# Altium footprint library RDM_ALT_PCB.PcbLib: 127 footprints (part 7 of 8)
Each footprint in its own frame and in the unit in brackets; x right, y up, seen from the top. Pads: shape width x height; smd on the part's side, far side on the other; paste and mask are expansions set on the pad; w line width, h text height; cw(c..) or ccw(c..) is an arc to the next point about the centre after c.
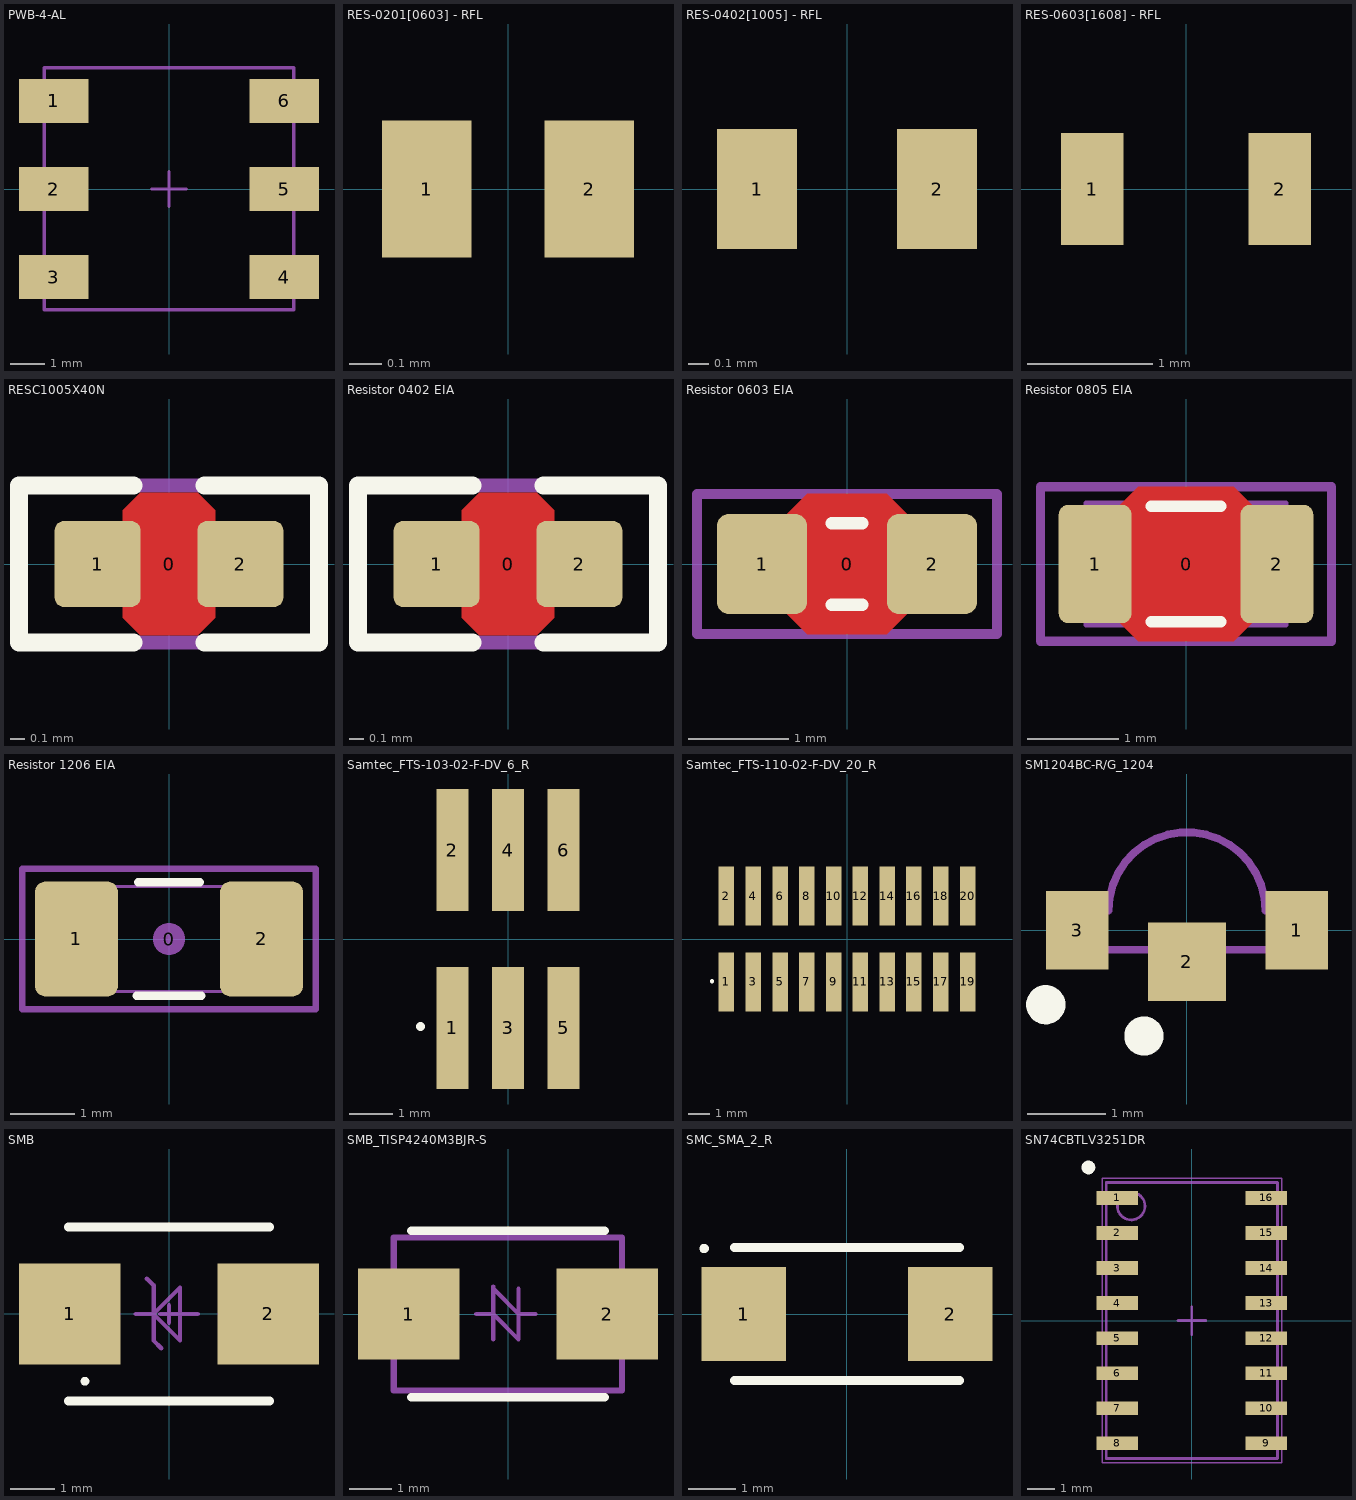
[diagram p6: the footprints below, top view; thin cyan lines are the x and y axes]

## PWB-4-AL [mm] "Surface Mount Wideband RF Transformer"
height 3.7
pads (6):
  rect 2x1.27 smd: 1(-3.325,2.54) 2(-3.325,0) 3(-3.325,-2.54) 4(3.325,-2.54) 5(3.325,0) 6(3.325,2.54)
Mechanical 13:
  lines w0.1: -3.6,-3.485 -3.6,3.5 3.6,3.5 3.6,-3.485 -3.6,-3.485
Mechanical 15:
  lines w0.1: -0.5,0 0.5,0 ; 0,-0.5 0,0.5
3D body "Coilcraft-PWB Series.step": height 4.65, standoff 0, extent -3.6,-3.485 3.6,3.485

## RES-0201[0603] - RFL [mm]
pads (2):
  rect 0.28x0.43 smd: 1(-0.255,0) 2(0.255,0)
3D body "User Library-SMD RESISTOR-10201.STEP": height 0.22, standoff -0.02, extent -0.3,-0.15 0.3,0.15

## RES-0402[1005] - RFL [mm] "SMD Chip 0402 - RES - RFL"
height 0.4
pads (2):
  rect 0.4x0.6 smd: 1(-0.45,0) 2(0.45,0)
3D body "RES0402.step": height 0.33, standoff -0.03, extent -0.5,-0.25 0.5,0.25

## RES-0603[1608] - RFL [mm] "SMD Chip 0603 - RES - RFL"
height 0.55
pads (2):
  rect 0.5x0.9 smd: 1(-0.75,0) 2(0.75,0)
3D body "RES0603.step": height 0.43, standoff -0.02, extent -0.8,-0.4 0.8,0.4

## RESC1005X40N [mm] "Chip Resistor, Body 1.0x0.5mm, EIA 0402, IPC Medium Density"
height 0.4
pads (3):
  round 0.2 on Mech15: 0(0,0)
  rrect20% 0.6x0.6 smd: 1(-0.5,0) 2(0.5,0)
Top Layer:
  pour cut-out: -0.325,0.375 -0.2,0.5 0.2,0.5 0.325,0.375 0.325,-0.375 0.2,-0.5 -0.2,-0.5 -0.325,-0.375
Top Overlay:
  lines w0.127: -0.25,-0.55 -1.05,-0.55 -1.05,0.55 -0.25,0.55 ; 0.25,-0.55 1.05,-0.55 1.05,0.55 0.25,0.55
Mechanical 13:
  lines w0.05: 0.225,-0.274 -0.225,-0.274 0.225,-0.274 ; -0.525,-0.275 -0.225,-0.275 -0.225,0.275 -0.525,0.275 -0.525,-0.275 ; -0.225,0.274 0.225,0.274 -0.225,0.274 ; 0.225,-0.275 0.225,0.275 0.525,0.275 0.525,-0.275 0.225,-0.275
Mechanical 15:
  lines w0.1: -1.05,-0.55 1.05,-0.55 1.05,0.55 -1.05,0.55 -1.05,-0.55
3D body "RES 0402 (1005 metric).STEP": height 0.4, standoff 0, extent -0.525,-0.275 0.525,0.275

## Resistor 0402 EIA [mm]
pads (3):
  round 0.2 on Mech15: 0(0,0)
  rrect20% 0.6x0.6 smd: 1(-0.5,0) 2(0.5,0)
Top Layer:
  pour cut-out: -0.325,0.375 -0.2,0.5 0.2,0.5 0.325,0.375 0.325,-0.375 0.2,-0.5 -0.2,-0.5 -0.325,-0.375
Top Overlay:
  lines w0.127: -0.25,-0.55 -1.05,-0.55 -1.05,0.55 -0.25,0.55 ; 0.25,-0.55 1.05,-0.55 1.05,0.55 0.25,0.55
Mechanical 13:
  lines w0.05: 0.225,-0.274 -0.225,-0.274 0.225,-0.274 ; -0.525,-0.275 -0.525,0.275 -0.225,0.275 -0.225,-0.275 -0.525,-0.275 ; -0.225,0.274 0.225,0.274 -0.225,0.274 ; 0.225,-0.275 0.525,-0.275 0.525,0.275 0.225,0.275 0.225,-0.275
Mechanical 15:
  lines w0.1: -1.05,-0.55 -1.05,0.55 1.05,0.55 1.05,-0.55 -1.05,-0.55
3D body "RES 0402 (1005 metric).STEP": height 0.4, standoff 0, extent -0.525,-0.275 0.525,0.275

## Resistor 0603 EIA [mm]
pads (3):
  round 0.254 on Mech15: 0(0,0)
  rrect25% 0.9x1 smd: 1(-0.85,0) 2(0.85,0)
Top Layer:
  pour cut-out: -0.6,0.5 -0.4,0.7 0.4,0.7 0.6,0.5 0.6,-0.5 0.4,-0.7 -0.4,-0.7 -0.6,-0.5
Top Overlay:
  lines w0.127: -0.152,-0.406 0.152,-0.406 ; -0.152,0.406 0.152,0.406
Mechanical 13:
  lines w0.05: -0.875,-0.475 -0.875,0.475 -0.475,0.475 -0.475,-0.475 -0.875,-0.475 ; -0.475,-0.474 0.475,-0.474 -0.475,-0.474 ; -0.475,0.474 0.475,0.474 -0.475,0.474 ; 0.475,-0.475 0.875,-0.475 0.875,0.475 0.475,0.475 0.475,-0.475
Mechanical 15:
  lines w0.1: -1.5,-0.7 1.5,-0.7 1.5,0.7 -1.5,0.7 -1.5,-0.7
3D body "RES 0603 (1608 metric).STEP": height 0.54, standoff -0.01, extent -0.875,-0.475 0.875,0.475

## Resistor 0805 EIA [mm]
pads (3):
  round 0.254 on Mech15: 0(0,0)
  rrect25% 0.8x1.3 smd: 1(-1,0) 2(1,0)
Top Layer:
  pour cut-out: -0.725,0.65 -0.525,0.85 0.525,0.85 0.725,0.65 0.725,-0.65 0.525,-0.85 -0.525,-0.85 -0.725,-0.65
Top Overlay:
  lines w0.127: -0.381,-0.635 0.381,-0.635 ; -0.381,0.635 0.381,0.635
Mechanical 13:
  lines w0.05: 0.6,-0.674 -0.6,-0.674 ; -0.6,-0.675 -0.6,0.675 -1.1,0.675 -1.1,-0.675 -0.6,-0.675 ; -0.6,-0.674 0.6,-0.674 ; 0.6,-0.675 0.6,0.675 ; 0.6,-0.675 1.1,-0.675 1.1,0.675 0.6,0.675 ; 0.6,0.674 -0.6,0.674 0.6,0.674
Mechanical 15:
  lines w0.1: -1.6,-0.85 1.6,-0.85 1.6,0.85 -1.6,0.85 -1.6,-0.85
3D body "RES 0805 (2012 metric).STEP": height 0.69, standoff -0.01, extent -1.1,-0.675 1.1,0.675

## Resistor 1206 EIA [mm]
pads (3):
  round 0.508 on Mech15: 0(0,0)
  rrect25% 1.3x1.8 smd: 1(-1.45,0) 2(1.45,0)
Top Overlay:
  lines w0.127: -0.508,-0.889 0.508,-0.889 ; -0.483,0.889 0.483,0.889
Mechanical 13:
  lines w0.05: 1.025,-0.824 -1.025,-0.824 1.025,-0.824 ; -1.625,-0.825 -1.025,-0.825 -1.025,0.825 -1.625,0.825 -1.625,-0.825 ; -1.025,0.824 1.025,0.824 -1.025,0.824 ; 1.025,-0.825 1.025,0.825 1.625,0.825 1.625,-0.825 1.025,-0.825
Mechanical 15:
  lines w0.1: -2.3,-1.1 -2.3,1.1 2.3,1.1 2.3,-1.1 -2.3,-1.1
3D body "RES 1206 (3216 metric).STEP": height 0.69, standoff -0.01, extent -1.625,-0.825 1.625,0.825

## Samtec_FTS-103-02-F-DV_6_R [mil] "Samtec_FTS-103-02-F-DV_6_R"
height 125
pads (6):
  rect 29x110 smd mask+2: 1(-50,-80) 2(-50,80) 3(0,-80) 4(0,80) 5(50,-80) 6(50,80)
Top Overlay:
  circle w7.87: c-78.74,-78.74 r0
3D body "FTS-103-02-F-DV.stp": height 125, standoff 0, extent -74.99,-114.99 75.01,115

## Samtec_FTS-110-02-F-DV_20_R [mil] "Samtec_FTS-110-02-F-DV_20_R"
height 125
pads (20):
  rect 29x110 smd mask+2: 1(-225,-80) 2(-225,80) 3(-175,-80) 4(-175,80) 5(-125,-80) 6(-125,80) 7(-75,-80) 8(-75,80) 9(-25,-80) 10(-25,80) 11(25,-80) 12(25,80) 13(75,-80) 14(75,80) 15(125,-80) 16(125,80) 17(175,-80) 18(175,80) 19(225,-80) 20(225,80)
Top Overlay:
  circle w7.87: c-251.97,-78.74 r0
3D body "FTS-110-02-F-DV.stp": height 125, standoff 0, extent -249.99,-114.99 250.01,115

## SM1204BC-R/G_1204 [mm]
pads (3):
  rect 0.8x1 smd: 1(1.4,0) 3(-1.4,0)
  rect 1x1 smd: 2(0,-0.4)
Top Overlay:
  circle w0.25: c-0.55,-1.35 r0.125
  circle w0.25: c-1.8,-0.95 r0.125
Mechanical 13:
  lines w0.1: -1.6,-0.25 -1.6,0.25 -1,0.25 cw(c0,0.25) 1,0.25 1.6,0.25 1.6,-0.25 -1.6,-0.25
3D body: height 1, standoff 0, extent -1,0.25 1,1.212
3D body: height 1, standoff 0, extent -1.6,-0.25 1.6,0.25
3D body: height 0.25, standoff 0, extent -0.55,1.7 -0.55,1.7
3D body: height 0.25, standoff 0, extent -0.35,1.75 -0.35,1.75

## SMB [mm] "DO-214-AA/SMB; 2 C-Bend Leads; Body 5.3 x 3.6 mm, inc. leads (LxW)"
height 2.54
pads (2):
  rect 2.3x2.3 smd: 1(-2.25,0) 2(2.25,0)
Top Overlay:
  circle w0.2: c-1.905,-1.524 r0
  lines w0.2: -2.285,-1.97 2.285,-1.97 ; -2.285,1.97 2.285,1.97
Mechanical 1:
  lines w0.1: -0.2,0 0.2,0 ; 0,-0.2 0,0.2
Mechanical 15:
  lines w0.1: -0.75,0 -0.35,0 ; -0.5,0.8 -0.35,0.65 -0.35,0.6 -0.35,-0.6 -0.175,-0.775 ; 0.25,0 0.65,0 ; -0.35,0 0.25,0.6 0.25,-0.6 -0.35,0

## SMB_TISP4240M3BJR-S [mm] "SMB_TISP4240M3BJR-S"
height 2.4
pads (2):
  rect 2.4x2.16 smd: 1(-2.35,0) 2(2.35,0)
Top Overlay:
  lines w0.2: -2.285,-1.97 2.285,-1.97 ; -2.285,1.97 2.285,1.97
Mechanical 13:
  lines w0.15: -2.7,-1.81 -2.7,1.81 2.7,1.81 2.7,-1.81 -2.7,-1.81
Mechanical 15:
  lines w0.01: -2.7,-1.81 2.7,-1.81
  lines w0.1: -0.75,0 -0.35,0 0.25,-0.6 0.25,0.6 ; -0.35,-0.6 -0.35,0.6 ; -0.35,0.65 -0.35,0.6 ; 0.65,0 0.25,0 -0.35,0.6
3D body "tisp4240m3bj.stp": height 2.13, standoff 0, extent -2.7,-1.81 2.7,1.81

## SMC_SMA_2_R [mm] "SMC_SMA_2_R"
height 2.95
pads (2):
  rect 1.8x2 smd: 1(-2.2,0) 2(2.2,0)
Top Overlay:
  circle w0.2: c-3.048,1.397 r0
  lines w0.2: -2.4,-1.42 2.4,-1.42 ; -2.4,1.42 2.4,1.42
3D body "DO-214 SMA.STEP": height 2.4, standoff 0, extent -2.6,-1.3 2.6,1.3

## SN74CBTLV3251DR [mm] "16-SOIC"
pads (16):
  rect 1.5x0.5 smd: 1(-2.7,4.445) 2(-2.7,3.175) 3(-2.7,1.905) 4(-2.7,0.635) 5(-2.7,-0.635) 6(-2.7,-1.905) 7(-2.7,-3.175) 8(-2.7,-4.445) 9(2.7,-4.445) 10(2.7,-3.175) 11(2.7,-1.905) 12(2.7,-0.635) 13(2.7,0.635) 14(2.7,1.905) 15(2.7,3.175) 16(2.7,4.445)
Top Overlay:
  circle w0.25: c-3.75,5.55 r0.125
Mechanical 13:
  circle w0.1: c-2.2,4.15 r0.5
  lines w0.1: -3.1,-5 -3.1,5 3.099,5 3.099,-5 -3.1,-5
Mechanical 15:
  lines w0.05: -3.25,-5.15 -3.25,5.15 3.25,5.15 3.25,-5.15 -3.25,-5.15
  lines w0.1: -0.5,0 0.5,0 ; 0,-0.5 0,0.5
3D body "D16.stp": height 1.76, standoff 0, extent -3.099,-5.004 3.099,5.004